# Altium footprint library PcbLib.PcbLib: 66 footprints (part 1 of 5)
Each footprint in its own frame and in the unit in brackets; x right, y up, seen from the top. Pads: shape width x height; smd on the part's side, far side on the other; paste and mask are expansions set on the pad; w line width, h text height; cw(c..) or ccw(c..) is an arc to the next point about the centre after c.
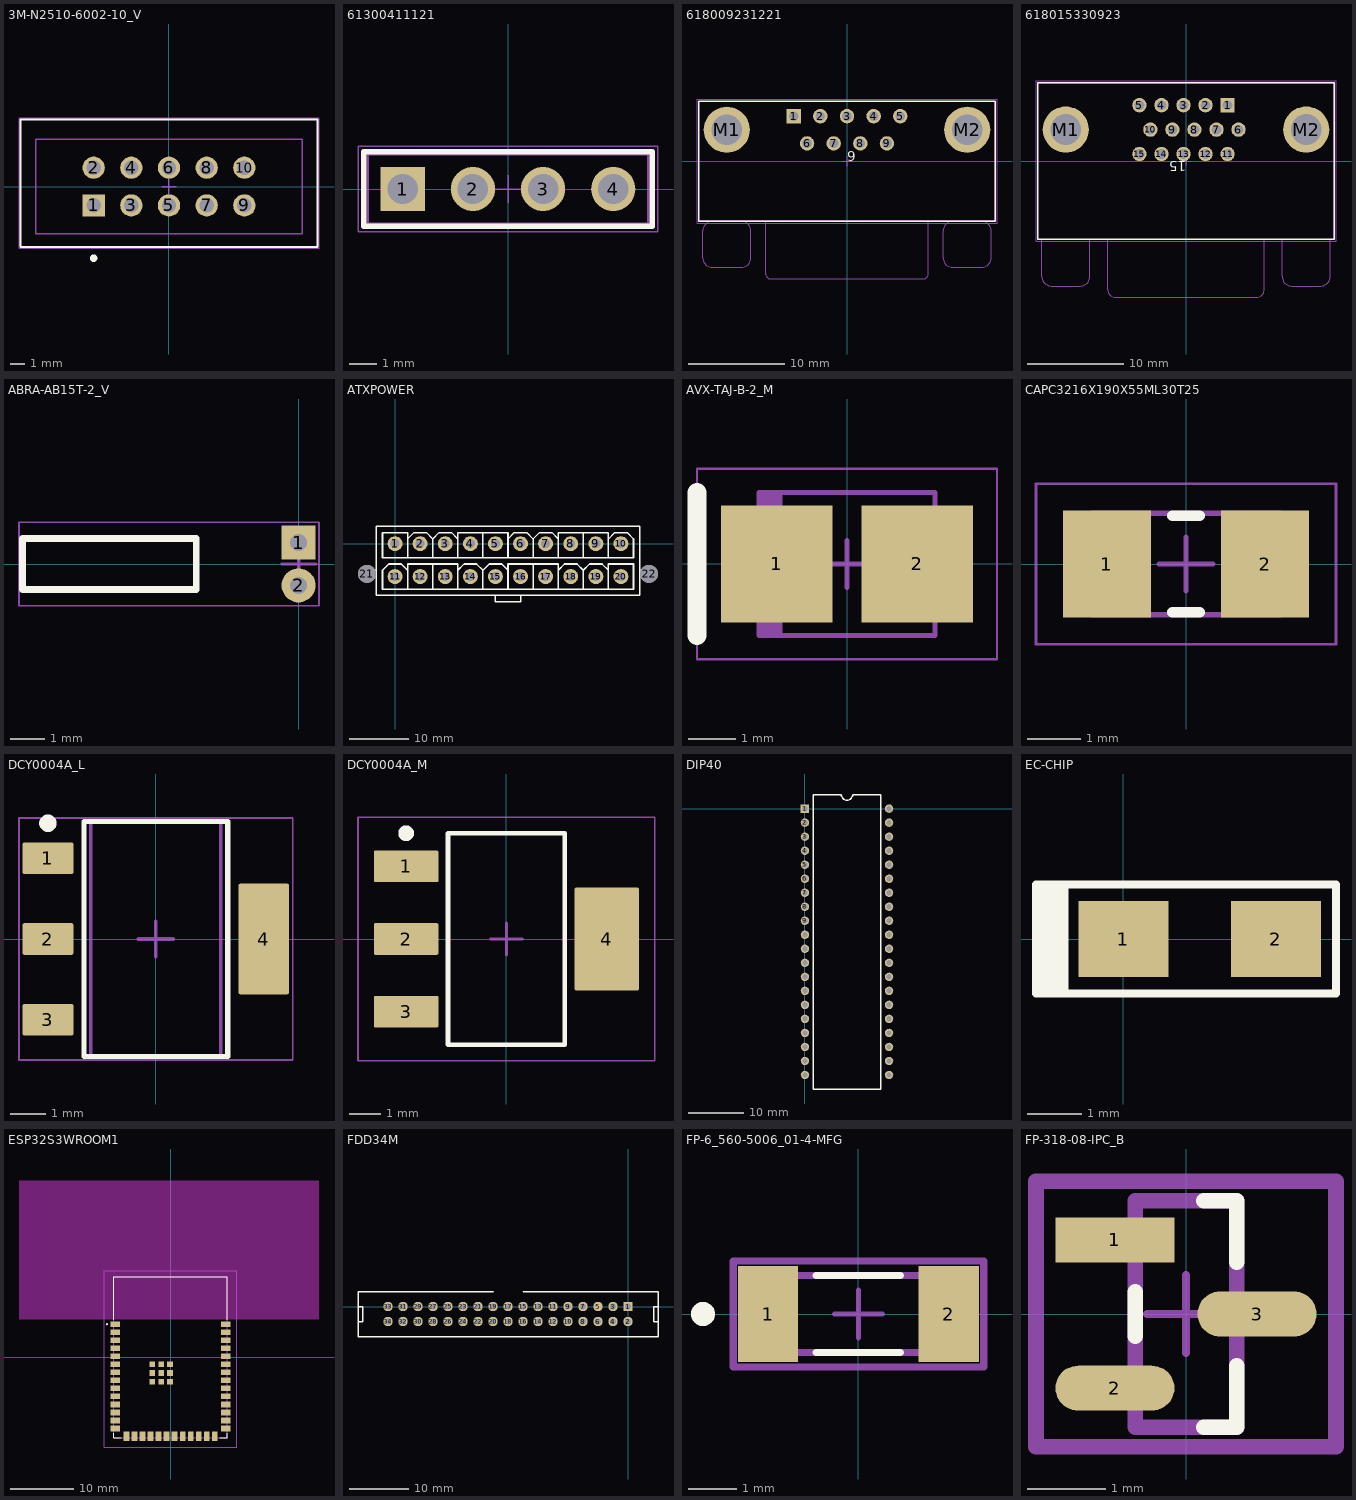
[diagram p0: the footprints below, top view; thin cyan lines are the x and y axes]

## 3M-N2510-6002-10_V [mm] "Header, 10-Leads, Body 20.02x8.59mm, Pitch 2.54mm"
height 9.91
pads (10):
  rect 1.5x1.5 hole 0.97: 1(-5.08,-1.27)
  round 1.5 hole 0.97: 2(-5.08,1.27) 3(-2.54,-1.27) 4(-2.54,1.27) 5(0,-1.27) 6(0,1.27) 7(2.54,-1.27) 8(2.54,1.27) 9(5.08,-1.27) 10(5.08,1.27)
Top Overlay:
  circle w0.25: c-5.08,-4.826 r0.125
  lines w0.15: -10.01,-4.07 -10.01,4.52 10.01,4.52 10.01,-4.07 -10.01,-4.07
Mechanical 13:
  lines w0.1: -10.01,-4.07 10.01,-4.07 10.01,4.52 -10.01,4.52 -10.01,-4.07 ; -8.99,-3.175 -8.99,3.175 8.99,3.175 8.99,-3.175 -8.99,-3.175
Mechanical 15:
  lines w0.05: -10.11,-4.17 -10.11,4.62 10.11,4.62 10.11,-4.17 -10.11,-4.17
  lines w0.1: -0.5,0 0.5,0 ; 0,-0.5 0,0.5
3D body: height 9.66, standoff -2.83, extent -2.876,-1.607 -2.203,-0.934
3D body "2510-6002-XX_STEP.stp": height 9.92, standoff -2.83, extent -10.007,-4.115 10.008,4.521
3D body: height 9.66, standoff -2.83, extent -0.336,-1.607 0.337,-0.934
3D body: height 9.66, standoff -2.83, extent 2.204,-1.607 2.877,-0.934
3D body: height 9.66, standoff -2.83, extent 2.204,0.933 2.877,1.606
3D body: height 9.66, standoff -2.83, extent -0.336,0.933 0.337,1.606
3D body: height 9.66, standoff -2.83, extent -2.876,0.933 -2.203,1.606

## 61300411121 [mm] "Pin Header, pitch 2.54 mm, THT, Vertical, single row, 4p"
height 8.54
pads (4):
  rect 1.6x1.6 hole 1.1: 1(-3.81,0)
  round 1.6 hole 1.1: 2(-1.27,0) 3(1.27,0) 4(3.81,0)
Top Overlay:
  lines w0.2: -5.23,-1.345 5.23,-1.345 5.23,1.345 -5.23,1.345 -5.23,-1.345
Mechanical 13:
  lines w0.1: -5.08,-1.27 -5.08,1.27 5.08,1.27 5.08,-1.27 -5.08,-1.27
Mechanical 15:
  lines w0.05: -0.5,0 0.5,0 ; 0,-0.5 0,0.5 ; -5.43,-1.545 -5.43,1.545 5.43,1.545 5.43,-1.545 -5.43,-1.545
3D body "61300411121.stp": height 8.57, standoff -2.97, extent -5.08,-1.27 5.08,1.27

## 618009231221 [mm] "9 pins, right angled, 8.08mm, with hex screw"
height 12.5
pads (11):
  rect 1.5x1.5 hole 1: 1(-5.54,4.69)
  round 1.5 hole 1: 2(-2.77,4.69) 3(0,4.69) 4(2.77,4.69) 5(5.54,4.69) 6(-4.155,1.85) 7(-1.385,1.85) 8(1.385,1.85) 9(4.155,1.85)
  round 4.8 hole 3.2: M1(-12.5,3.27) M2(12.5,3.27)
Top Overlay:
  lines w0.15: -15.4,-6.25 -15.4,6.25 15.4,6.25 15.4,-6.25 -15.4,-6.25
  text "9" at 0,0 h1.02
Mechanical 2:
  lines w0.1: -15.4,-6.15 15.4,-6.15
  text "PCB Edge" at 0,0 h1.02
Mechanical 13:
  lines w0.1: -14,-6.25 ccw(c-14,-7.25) -15,-7.25 -15,-10.05 ccw(c-14,-10.05) -14,-11.05 -11,-11.05 ccw(c-11,-10.05) -10,-10.05 -10,-7.25 ccw(c-11,-7.25) -11,-6.25 ; -8.46,-6.25 -8.46,-11.73 ccw(c-7.96,-11.73) -7.96,-12.23 7.94,-12.23 ; 7.96,-12.23 ccw(c7.96,-11.73) 8.46,-11.73 8.46,-6.25 ; 11,-6.25 ccw(c11,-7.25) 10,-7.25 10,-10.05 ccw(c11,-10.05) 11,-11.05 14,-11.05 ccw(c14,-10.05) 15,-10.05 15,-7.25 ccw(c14,-7.25) 14,-6.25 ; -15.4,-6.25 15.4,-6.25 15.4,6.25 -15.4,6.25 -15.4,-6.25 ; 7.95,-12.23 7.95,-12.23
Mechanical 15:
  lines w0.05: -0.5,0 0.5,0 ; 0,-0.5 0,0.5 ; -15.6,-6.45 15.6,-6.45 15.6,6.45 -15.6,6.45 -15.6,-6.45
3D body "618009231221.stp": height 12.55, standoff -3.8, extent -15.405,-12.25 15.405,6.25

## 618015330923 [mm] "15 pins, right angled"
height 12.5
pads (17):
  rect 1.5x1.5 hole 1: 1(4.32,5.82)
  round 1.5 hole 1: 2(2.03,5.82) 3(-0.26,5.82) 4(-2.55,5.82) 5(-4.84,5.82) 6(5.46,3.28) 7(3.17,3.28) 8(0.88,3.28) 9(-1.41,3.28) 10(-3.7,3.28) 11(4.32,0.74) 12(2.03,0.74) 13(-0.26,0.74) 14(-2.55,0.74) 15(-4.84,0.74)
  round 4.8 hole 3.2: M1(-12.5,3.28) M2(12.5,3.28)
Top Overlay:
  lines w0.15: -15.4,-8.15 -15.4,8.15 15.4,8.15 15.4,-8.15 -15.4,-8.15
  text "15" at 0,0 h1.02
Mechanical 2:
  lines w0.1: -15.4,-8.15 15.4,-8.15
  text "PCB Edge" at 0,0 h1.02
Mechanical 13:
  lines w0.1: -15,-8.15 -15,-11.99 ccw(c-14,-11.99) -14,-12.99 -11,-12.99 ccw(c-11,-11.99) -10,-11.99 -10,-8.15 ; -8.15,-8.15 -8.15,-13.35 ccw(c-7.35,-13.35) -7.35,-14.15 7.35,-14.15 ccw(c7.35,-13.35) 8.15,-13.35 8.15,-8.15 ; 10,-8.15 10,-11.99 ccw(c11,-11.99) 11,-12.99 14,-12.99 ccw(c14,-11.99) 15,-11.99 15,-8.15 ; -15.4,-8.15 15.4,-8.15 15.4,8.15 -15.4,8.15 -15.4,-8.15
Mechanical 15:
  lines w0.05: -0.5,0 0.5,0 ; 0,-0.5 0,0.5 ; -15.6,-8.35 -15.6,8.35 15.6,8.35 15.6,-8.35 -15.6,-8.35
3D body "618015330923.stp": height 12.55, standoff -3.95, extent -15.4,-14.15 15.4,8.15

## ABRA-AB15T-2_V [mm] "THD, 2-Leads, Body 5.1x1.5mm, Height 1.5mm"
height 1.5
pads (2):
  rect 1x1 hole 0.5: 1(0,0.627)
  round 1 hole 0.5: 2(0,-0.627)
Top Overlay:
  lines w0.2: -8.1,-0.75 -3,-0.75 -3,0.75 -8.1,0.75 -8.1,-0.75
Mechanical 13:
  lines w0.1: -8.1,-0.75 -3,-0.75 -3,0.75 -8.1,0.75 -8.1,-0.75
Mechanical 15:
  lines w0.05: -8.2,-1.227 -8.2,1.227 0.6,1.227 0.6,-1.227 -8.2,-1.227
  lines w0.1: -0.5,0 0.5,0 ; 0,-0.5 0,0.5
3D body: height 0.75, standoff -0.85, extent -0.177,0.523 0.072,0.772
3D body: height 0.75, standoff -0.85, extent -0.144,-0.705 0.105,-0.456
3D body: height 0.88, standoff 0.63, extent -0.144,-0.705 0.105,-0.456
3D body: height 0.88, standoff 0.63, extent -0.177,0.523 0.072,0.772
3D body: height 0.87, standoff 0.63, extent -3.044,0.132 -0.037,0.771
3D body: height 0.87, standoff 0.63, extent -3.011,-0.704 -0.004,-0.065
3D body: height 1.5, standoff 0, extent -8.1,-0.744 -3,0.75

## ATXPOWER [mm]
pads (22):
  round 2.5 hole 1.5: 1(0,0) 2(4.2,0) 3(8.4,0) 4(12.6,0) 5(16.8,0) 6(21,0) 7(25.2,0) 8(29.4,0) 9(33.6,0) 10(37.8,0) 11(0,-5.5) 12(4.2,-5.5) 13(8.4,-5.5) 14(12.6,-5.5) 15(16.8,-5.5) 16(21,-5.5) 17(25.2,-5.5) 18(29.4,-5.5) 19(33.6,-5.5) 20(37.8,-5.5)
  round 3 hole 3 unplated: 21(-4.7,-5.04) 22(42.5,-5.04)
Top Overlay:
  lines w0.254: -3.65,-4.376 ccw(c-4.6,-4.97) -3.598,-5.472 ; -3.556,-5.334 -3.175,-5.334 ; -3.556,-4.445 -3.175,-4.445 ; 2.1,0.8 3.15,1.85 5.25,1.85 6.3,0.8 ; 10.5,-4.45 11.55,-3.4 13.65,-3.4 14.7,-4.45 ; 16.8,-8.65 16.8,-9.7 21,-9.7 21,-8.65 ; 41.021,-5.334 41.402,-5.334 ; 41.021,-4.445 41.402,-4.445 ; 41.444,-5.472 ccw(c42.446,-4.97) 41.496,-4.376 ; 2.1,-7.6 6.3,-7.6 ; 2.1,-7.6 -2.1,-7.6 -2.1,-4.45 -1.05,-3.4 1.05,-3.4 2.1,-4.45 ; 2.1,-7.6 2.1,-4.45 ; 2.1,-4.45 2.1,-3.4 6.3,-3.4 ; 2.1,-2.35 6.3,-2.35 ; 2.1,-2.35 2.1,1.85 -2.1,1.85 -2.1,-2.35 2.1,-2.35 ; 6.3,-7.6 10.5,-7.6 ; 6.3,-7.6 6.3,-3.4 ; 6.3,-3.4 10.5,-3.4 10.5,-7.6 ; 6.3,-2.35 10.5,-2.35 ; 6.3,-2.35 6.3,0.8 ; 6.3,0.8 7.35,1.85 9.45,1.85 10.5,0.8 ; 10.5,-7.6 14.7,-7.6 ; 10.5,-2.35 10.5,0.8 ; 10.5,-2.35 14.7,-2.35 ; 10.5,0.8 10.5,1.85 14.7,1.85 ; 14.7,-7.6 18.9,-7.6 ; 14.7,-7.6 14.7,-4.45 ; 14.7,-4.45 15.75,-3.4 17.85,-3.4 18.9,-4.45 ; 14.7,-2.35 18.9,-2.35 ; 14.7,-2.35 14.7,1.85 ; 14.7,1.85 18.9,1.85 18.9,-2.35 ; 18.9,-7.6 23.1,-7.6 ; 18.9,-7.6 18.9,-4.45 ; 18.9,-4.45 18.9,-3.4 23.1,-3.4 ; 18.9,-2.35 18.9,0.8 19.95,1.85 22.05,1.85 23.1,0.8 ; 18.9,-2.35 23.1,-2.35 ; 23.1,-7.6 27.3,-7.6 ; 23.1,-7.6 23.1,-3.4 ; 23.1,-3.4 27.3,-3.4 27.3,-7.6 ; 23.1,-2.35 27.3,-2.35 ; 23.1,-2.35 23.1,0.8 ; 23.1,-2.35 23.1,0.8 ; 23.1,0.8 24.15,1.85 26.25,1.85 27.3,0.8 ; 27.3,-7.6 31.5,-7.6 ; 27.3,-7.6 27.3,-4.45 28.35,-3.4 30.45,-3.4 31.5,-4.45 ; 27.3,-2.35 27.3,0.8 ; 27.3,-2.35 31.5,-2.35 ; 27.3,0.8 27.3,1.85 31.5,1.85 ; 31.5,-7.6 35.7,-7.6 ; 31.5,-7.6 31.5,-4.45 ; 31.5,-4.45 32.55,-3.4 34.65,-3.4 35.7,-4.45 35.7,-7.6 ; 31.5,-2.35 35.7,-2.35 ; 31.5,-2.35 31.5,1.85 ; 31.5,1.85 35.7,1.85 35.7,-2.35 ; 35.7,-7.6 39.9,-7.6 39.9,-3.4 35.7,-3.4 35.7,-7.6 ; 35.7,-2.35 35.7,0.8 36.75,1.85 38.85,1.85 39.9,0.8 39.9,-2.35 35.7,-2.35 ; -3.15,-8.65 40.95,-8.65 40.95,2.9 -3.15,2.9 -3.15,-8.65
3D body "c-2-1775099-7-e-3d.stp": height 13, standoff -3, extent -5.7,-8.8 43.5,2.1

## AVX-TAJ-B-2_M [mm] "Molded Capacitor, 2-Leads, Body 3.7x3mm, IPC Low Density"
height 2.1
pads (2):
  rect 2.35x2.45 smd: 1(-1.475,0) 2(1.475,0)
Top Overlay:
  lines w0.4: -3.15,-1.5 -3.15,1.5
Top Value:
  text ".Value" at -1.511,-0.394 h1.25
  text ".Value" at -1.511,-0.394 h1.25
Mechanical 13:
  rectangle: -1.85,-1.5 -1.352,1.5
  lines w0.1: -1.85,-1.5 1.85,-1.5 1.85,1.5 -1.85,1.5 -1.85,-1.5
Mechanical 15:
  lines w0.05: -3.15,-2 3.15,-2 3.15,2 -3.15,2 -3.15,-2
  lines w0.1: -0.5,0 0.5,0 ; 0,-0.5 0,0.5
3D body "CAPMP3529X21M.step": height 2.1, standoff 0, extent -2.07,-1.5 2.07,1.5

## CAPC3216X190X55ML30T25 [mm] "Chip Capacitor, 2-Leads, Body 3.5x1.9mm, IPC Low Density"
height 1.9
pads (2):
  rect 1.65x2 smd: 1(-1.475,0) 2(1.475,0)
Top Overlay:
  lines w0.2: -0.25,-0.9 0.25,-0.9 ; -0.25,0.9 0.25,0.9
Top Value:
  text ".Value" at -1.511,-0.394 h1.25
Mechanical 13:
  lines w0.1: -1.75,-0.95 -1.75,0.95 1.75,0.95 1.75,-0.95 -1.75,-0.95
Mechanical 15:
  lines w0.05: -2.8,-1.5 -2.8,1.5 2.8,1.5 2.8,-1.5 -2.8,-1.5
  lines w0.1: -0.5,0 0.5,0 ; 0,-0.5 0,0.5
3D body "CAPC3216X19M.step": height 1.9, standoff 0, extent -1.75,-0.95 1.75,0.95

## DCY0004A_L [mm] "SOT223, 4-Leads, Body 6.7x3.7mm, Pitch 2.3mm, IPC High Density"
height 1.8
pads (4):
  rrect11% 1.45x0.9 smd: 1(-3.075,2.3) 2(-3.075,0) 3(-3.075,-2.3)
  rrect7% 1.45x3.15 smd: 4(3.075,0)
Top Overlay:
  circle w0.25: c-3.075,3.3 r0.125
  lines w0.15: -2.05,-3.35 -2.05,3.35 2.05,3.35 2.05,-3.35 -2.05,-3.35
Mechanical 1:
  text ".Designator" at 0,0 h0.8
Top Value:
  text ".Value" at -0.394,1.511 h1.25
Mechanical 13:
  lines w0.1: -1.85,-3.35 -1.85,3.35 1.85,3.35 1.85,-3.35 -1.85,-3.35
Mechanical 15:
  lines w0.05: -3.9,-3.45 -3.9,3.45 3.9,3.45 3.9,-3.45 -3.9,-3.45
  lines w0.1: -0.5,0 0.5,0 ; 0,-0.5 0,0.5
3D body "SOT-223.stp": height 1.62, standoff -0.03, extent -3.5,-3.25 3.5,3.25

## DCY0004A_M [mm] "SOT223, 4-Leads, Body 6.7x3.7mm, Pitch 2.3mm, IPC Low Density"
height 1.8
pads (4):
  rrect10% 2.05x1 smd: 1(-3.175,2.3) 2(-3.175,0) 3(-3.175,-2.3)
  rrect5% 2.05x3.25 smd: 4(3.175,0)
Top Overlay:
  circle w0.25: c-3.175,3.35 r0.125
  lines w0.15: -1.85,-3.35 -1.85,3.35 1.85,3.35 1.85,-3.35 -1.85,-3.35
Mechanical 1:
  text ".Designator" at 0,0 h0.8
Top Value:
  text ".Value" at -0.394,1.511 h1.25
Mechanical 13:
  lines w0.1: -1.85,-3.35 -1.85,3.35 1.85,3.35 1.85,-3.35 -1.85,-3.35
Mechanical 15:
  lines w0.05: -4.7,-3.85 -4.7,3.85 4.7,3.85 4.7,-3.85 -4.7,-3.85
  lines w0.1: -0.5,0 0.5,0 ; 0,-0.5 0,0.5
3D body "SOT-223.stp": height 1.62, standoff -0.03, extent -3.5,-3.25 3.5,3.25

## DIP40 [mil]
pads (40):
  rect 60x60 hole 38: 1(0,0)
  round 60 hole 38: 2(0,-100) 3(0,-200) 4(0,-300) 5(0,-400) 6(0,-500) 7(0,-600) 8(0,-700) 9(0,-800) 10(0,-900) 11(0,-1000) 12(0,-1100) 13(0,-1200) 14(0,-1300) 15(0,-1400) 16(0,-1500) 17(0,-1600) 18(0,-1700) 19(0,-1800) 20(0,-1900) 21(600,-1900) 22(600,-1800) 23(600,-1700) 24(600,-1600) 25(600,-1500) 26(600,-1400) 27(600,-1300) 28(600,-1200) 29(600,-1100) 30(600,-1000) 31(600,-900) 32(600,-800) 33(600,-700) 34(600,-600) 35(600,-500) 36(600,-400) 37(600,-300) 38(600,-200) 39(600,-100) 40(600,0)
Top Overlay:
  lines w10: 60,-2000 60,100 260,100 ccw(c300,100) 340,100 540,100 540,-2000 60,-2000
Top Value:
  text ".Value" at 442.78,72.91 h118.11
3D body "c-3-1571552-2-e-3d.stp": height 177.17, standoff -112.83, extent -48.78,-1946.82 647.22,49.18

## EC-CHIP [mm]
pads (2):
  rect 1.65x1.4 smd: 1(0,0) 2(2.8,0)
Top Overlay:
  rectangle: -1.6,-1 -1,1
  lines w0.15: -1.6,-1 3.9,-1 3.9,1 -1.6,1 -1.6,-1
Top Value:
  text ".Value" at -0.114,-0.394 h1.25
3D body "T520A476M006ATE150.STEP": height 1.8, standoff 0, extent -0.2,-0.8 3,0.8

## ESP32S3WROOM1 [mm]
pads (49):
  rect 1.5x0.9 smd: 1(-8.75,5.26) 2(-8.75,3.99) 3(-8.75,2.72) 4(-8.75,1.45) 5(-8.75,0.18) 6(-8.75,-1.09) 7(-8.75,-2.36) 8(-8.75,-3.63) 9(-8.75,-4.9) 10(-8.75,-6.17) 11(-8.75,-7.44) 12(-8.75,-8.71) 13(-8.75,-9.98) 14(-8.75,-11.25) 27(8.75,-11.25) 28(8.75,-9.98) 29(8.75,-8.71) 30(8.75,-7.44) 31(8.75,-6.17) 32(8.75,-4.9) 33(8.75,-3.63) 34(8.75,-2.36) 35(8.75,-1.09) 36(8.75,0.18) 37(8.75,1.45) 38(8.75,2.72) 39(8.75,3.99) 40(8.75,5.26)
  rect 0.9x1.5 smd: 15(-6.985,-12.5) 16(-5.715,-12.5) 17(-4.445,-12.5) 18(-3.175,-12.5) 19(-1.905,-12.5) 20(-0.635,-12.5) 21(0.635,-12.5) 22(1.905,-12.5) 23(3.175,-12.5) 24(4.445,-12.5) 25(5.715,-12.5) 26(6.985,-12.5)
  rect 0.9x0.9 smd: EPAD(-2.9,-3.86) EPAD(-2.9,-2.46) EPAD(-2.9,-1.06) EPAD(-1.5,-3.86) EPAD(-1.5,-2.46) EPAD(-1.5,-1.06) EPAD(-0.1,-3.86) EPAD(-0.1,-2.46) EPAD(-0.1,-1.06)
Top Overlay:
  lines w0.15: -9,-12 -9,-12.75 -7.8,-12.75 ; -9,6 -9,12.75 9,12.75 9,6 ; 7.8,-12.75 9,-12.75 9,-12
  lines w0.2: -10.1,5.26 ccw(c-10.05,5.26) -10,5.26 ; -10.1,5.26 cw(c-10.05,5.26) -10,5.26 ; -10.1,5.26 ccw(c-10.05,5.26) -10,5.26
Keep-Out Layer:
  rectangle: -24,6 23.5,28
Mechanical 13:
  lines w0.1: -9,-12.75 9,-12.75 9,12.75 -9,12.75 -9,-12.75
Mechanical 15:
  lines w0.1: -10.5,-14.25 10.5,-14.25 10.5,13.75 -10.5,13.75 -10.5,-14.25
3D body "esp-wroom-32.step": height 3, standoff -0.04, extent -9.035,-12.753 9.035,12.787

## FDD34M [mm]
pads (34):
  rect 1.6x1.6 hole 1.1: 1(0,0)
  round 1.6 hole 1.1: 2(0,-2.54) 3(-2.54,0) 4(-2.54,-2.54) 6(-5.08,-2.54) 7(-7.62,0) 8(-7.62,-2.54) 9(-10.16,0) 10(-10.16,-2.54) 11(-12.7,0) 12(-12.7,-2.54) 13(-15.24,0) 14(-15.24,-2.54) 15(-17.78,0) 16(-17.78,-2.54) 17(-20.32,0) 18(-20.32,-2.54) 19(-22.86,0) 20(-22.86,-2.54) 21(-25.4,0) 22(-25.4,-2.54) 23(-27.94,0) 24(-27.94,-2.54) 25(-30.48,0) 26(-30.48,-2.54) 27(-33.02,0) 28(-33.02,-2.54) 29(-35.56,0) 30(-35.56,-2.54) 31(-38.1,0) 32(-38.1,-2.54) 33(-40.64,0) 34(-40.64,-2.54)
  round 1.6 smd: 5(-5.08,0)
Top Overlay:
  lines w0.254: -45.72,-2.54 -44.958,-2.54 -44.958,0 -45.72,0 ; -22.86,2.54 -45.72,2.54 -45.72,-5.08 5.08,-5.08 5.08,2.54 -17.78,2.54 ; 5.08,-2.54 4.318,-2.54 4.318,0 5.08,0
3D body "IDC-34MS CONNFLY.step": height 9.1, standoff -3.5, extent -45.81,-5.67 5.17,3.23

## FP-6_560-5006_01-4-MFG [mm]
pads (2):
  rect 1.25x2 smd paste+0 mask+0: 1(-1.875,0) 2(1.875,0)
Top Overlay:
  circle w0.25: c-3.225,0 r0.125
  lines w0.15: -0.875,-0.8 0.875,-0.8 ; -0.875,0.8 0.875,0.8
Top Value:
  text ".Value" at -1.511,-0.394 h1.25
Top 3D Body:
  lines w0.15: -1.85,-0.8 -1.85,0.8 1.85,0.8 1.85,-0.8 -1.85,-0.8
Top Courtyard:
  lines w0.15: -2.6,-1.1 -2.6,1.1 2.6,1.1 2.6,-1.1 -2.6,-1.1
Top Assembly:
  lines w0.15: -2.6,-1.1 -2.6,1.1 2.6,1.1 2.6,-1.1 -2.6,-1.1
  text ".Value" at 0,0.01 h1
Top Component Center:
  lines w0.1: -0.5,0 0.5,0 ; 0,-0.5 0,0.5
3D body "Diode_Vishay_Semiconductor_Diodes_Division_LS4148-GS08_eec.STEP": height 0.25, standoff 0, extent -2.6,-1.1 2.6,1.1

## FP-318-08-IPC_B [mm]
height 5.27
pads (3):
  rect 1.524x0.578 smd paste+0 mask+0: 1(-0.91,0.95)
  rrect100% 1.524x0.578 smd paste+0 mask+0: 2(-0.91,-0.95) 3(0.91,0)
Top Overlay:
  lines w0.2: -0.65,-0.286 -0.65,0.286 ; 0.227,-1.45 0.65,-1.45 0.65,-0.664 ; 0.227,1.45 0.65,1.45 0.65,0.664
Top Value:
  text ".Value" at -1.511,1.892 h1.25
Top 3D Body:
  lines w0.2: -0.65,-1.45 0.65,-1.45 0.65,1.45 -0.65,1.45 -0.65,-1.45
Top Courtyard:
  lines w0.2: -1.922,-1.7 1.922,-1.7 1.922,1.7 -1.922,1.7 -1.922,-1.7
Top Assembly:
  lines w0.2: -1.922,-1.7 1.922,-1.7 1.922,1.7 -1.922,1.7 -1.922,-1.7
  text ".Designator" at 0,0.188 h1
Top Component Center:
  lines w0.1: -0.5,0 0.5,0 ; 0,-0.5 0,0.5
3D body "IC_ON_Semiconductor_NUD3112LT1G_eec.STEP": height 0.25, standoff 0, extent -1.922,-1.7 1.922,1.7